# Altium footprint library Sigma_Library.PcbLib: 125 footprints (part 7 of 8)
Each footprint in its own frame and in the unit in brackets; x right, y up, seen from the top. Pads: shape width x height; smd on the part's side, far side on the other; paste and mask are expansions set on the pad; w line width, h text height; cw(c..) or ccw(c..) is an arc to the next point about the centre after c.
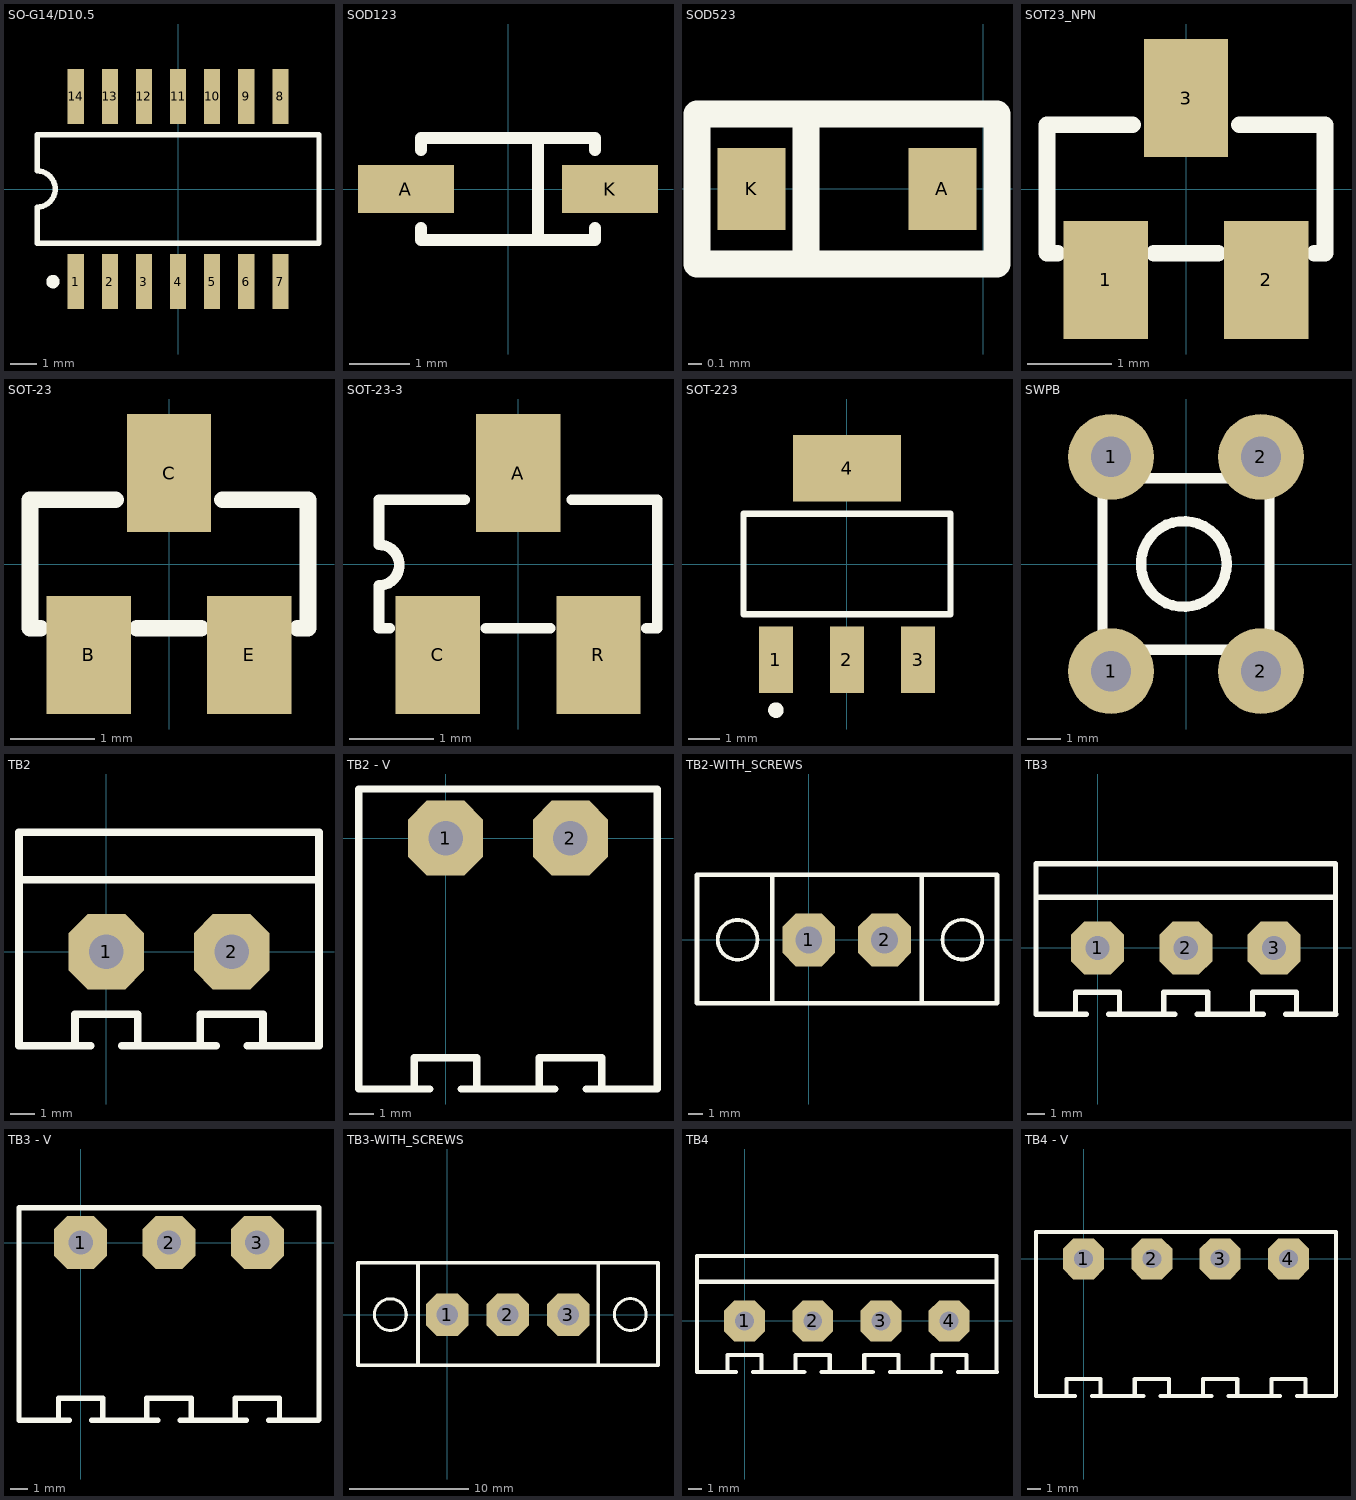
[diagram p6: the footprints below, top view; thin cyan lines are the x and y axes]

## SO-G14/D10.5 [mm] "Small Outline; 14 Leads; Body Width 5.3 mm; Pitch 1.27 mm"
height 2
pads (14):
  rect 0.6x2.05 smd: 1(-3.81,-3.45) 2(-2.54,-3.45) 3(-1.27,-3.45) 4(0,-3.45) 5(1.27,-3.45) 6(2.54,-3.45) 7(3.81,-3.45) 8(3.81,3.45) 9(2.54,3.45) 10(1.27,3.45) 11(0,3.45) 12(-1.27,3.45) 13(-2.54,3.45) 14(-3.81,3.45)
Top Overlay:
  circle w0.25: c-4.66,-3.45 r0.125
  lines w0.2: -5.25,-2.025 -5.25,-0.675 ccw(c-5.25,0) -5.25,0.675 -5.25,2.025 5.25,2.025 5.25,-2.025 -5.25,-2.025

## SOD123 [mm] "SOD-123; 2 Leads; Body 2.7 x 1.6 mm, (LxW)"
height 1.35
pads (2):
  rect 1.6x0.8 smd: A(-1.7,0) K(1.7,0)
Top Overlay:
  lines w0.2: -1.45,-0.65 -1.45,-0.85 1.45,-0.85 1.45,-0.65 ; -1.45,0.65 -1.45,0.85 1.45,0.85 1.45,0.65 ; 0.5,-0.85 0.5,0.85

## SOD523 [mm] "Diode 1n4148"
height 1.35
pads (2):
  rect 0.5x0.6 smd: A(-0.3,0) K(-1.7,0)
Top Overlay:
  lines w0.2: -1.3,-0.5 -1.3,0.5 ; -2.1,-0.55 0.1,-0.55 0.1,0.55 -2.1,0.55 -2.1,-0.55

## SOT23_NPN [mm]
pads (3):
  rect 1x1.4 smd: 1(-0.953,-1.079) 2(0.953,-1.079) 3(0,1.079)
Top Overlay:
  lines w0.2: -1.524,-0.762 -1.651,-0.762 -1.651,0.762 -0.635,0.762 ; -0.381,-0.762 0.381,-0.762 ; 0.635,0.762 1.651,0.762 1.651,-0.762 1.524,-0.762
3D body "SOT-23-1.STEP": height 0.98, standoff -0.01, extent -1.46,-1.274 1.46,1.274

## SOT-23 [mm]
pads (3):
  rect 1x1.4 smd: B(-0.953,-1.079) C(0,1.079) E(0.953,-1.079)
Top Overlay:
  lines w0.2: -1.524,-0.762 -1.651,-0.762 -1.651,0.762 -0.635,0.762 ; -0.381,-0.762 0.381,-0.762 ; 0.635,0.762 1.651,0.762 1.651,-0.762 1.524,-0.762
3D body "SOT-23-1.STEP": height 0.98, standoff -0.01, extent -1.46,-1.274 1.46,1.274

## SOT-23-3 [mm]
height 1.75
pads (3):
  rect 1x1.4 smd: A(0,1.079) C(-0.953,-1.079) R(0.953,-1.079)
Top Overlay:
  lines w0.127: -1.524,-0.762 -1.651,-0.762 -1.651,-0.254 ccw(c-1.651,-0.013) -1.651,0.229 -1.651,0.762 -0.635,0.762 ; -0.381,-0.762 0.381,-0.762 ; 0.635,0.762 1.651,0.762 1.651,-0.762 1.524,-0.762
3D body "SOT-23-1.STEP": height 0.98, standoff -0.01, extent -1.46,-1.274 1.46,1.274

## SOT-223 [mm] "SOT-223/SC-73; 4 Leads; Body 6.7 x 7.3 mm, inc. leads (LxW max)"
height 1.8
pads (4):
  rect 1.1x2.15 smd: 1(-2.3,-3.1) 2(0,-3.1) 3(2.3,-3.1)
  rect 3.5x2.15 smd: 4(0,3.1)
Top Overlay:
  circle w0.25: c-2.3,-4.725 r0.125
  lines w0.2: -3.35,-1.625 3.35,-1.625 3.35,1.625 -3.35,1.625 -3.35,-1.625
3D body "SOT223-3.step": height 1.6, standoff 0, extent -3.249,-3.613 3.251,3.461

## SWPB [mil]
pads (4):
  round 100 hole 47.24: 1(-87.5,-125) 1(-87.5,125) 2(87.5,-125) 2(87.5,125)
Top Overlay:
  circle w12: c-2.5,0 r50
  lines w12: -97.5,-100 97.5,-100 97.5,100 -97.5,100 -97.5,-100
3D body "c-1825967-1-c-3d.stp": height 311.02, standoff -122.05, extent -118.22,-153.41 118,153.41

## TB2 [mil] "Terminal Block Straight"
pads (2):
  oct 120x120 hole 55.12: 1(0,0) 2(200,0)
Top Overlay:
  lines w12: -139.37,115 339.37,115 ; -50,-150 -50,-100 50,-100 50,-150 ; -25,-150 -139.37,-150 -139.37,75 -139.37,190.75 339.37,190.75 339.37,75 339.37,-150 225,-150 ; 25,-150 175,-150 ; 150,-150 150,-100 250,-100 250,-150

## TB2 - V [mil] "Terminal Block Vertical"
pads (2):
  oct 120x120 hole 55.12: 1(0,0) 2(200,0)
Top Overlay:
  lines w12: -139.37,75 -139.37,-401.97 -25,-401.97 ; -139.37,78.74 339.37,78.74 ; -50,-401.97 -50,-351.97 50,-351.97 50,-401.97 ; 25,-401.97 175,-401.97 ; 150,-401.97 150,-351.97 250,-351.97 250,-401.97 ; 225,-401.97 339.37,-401.97 339.37,75
3D body "15EDGRC-5.08- 02P-14-00A(H).stp": height 283.46, standoff -133.86, extent -100,-314.96 300,47.24

## TB2-WITH_SCREWS [mm] "TB2-with_screws_Straight"
pads (2):
  oct 3.54x3.54 hole 1.8: 1(0,0) 2(5.08,0)
Top Overlay:
  circle w0.254: c-4.761,0 r1.331
  circle w0.254: c10.279,0.01 r1.331
  lines w0.305: -7.476,-4.25 -7.476,4.36 ; -7.446,-4.25 7.574,-4.25 7.574,4.36 -7.446,4.36 ; -2.446,-4.25 -2.446,4.36 ; 7.514,4.36 12.599,4.36 12.599,-4.24 7.524,-4.24

## TB3 [mil] "Terminal Block Straight"
pads (3):
  oct 120x120 hole 55.12: 1(0,0) 2(200,0) 3(400,0)
Top Overlay:
  lines w12: -139.37,115 539.37,115 ; -50,-150 -50,-100 50,-100 50,-150 ; -25,-150 -139.37,-150 -139.37,75 -139.37,190.75 539.37,190.75 539.37,75 539.37,-150 ; 25,-150 175,-150 ; 150,-150 150,-100 250,-100 250,-150 ; 226,-150 376,-150 ; 351,-150 351,-100 451,-100 451,-150 ; 426,-150 540.35,-150

## TB3 - V [mil] "Terminal Block Vertical"
pads (3):
  oct 120x120 hole 55.12: 1(0,0) 2(200,0) 3(400,0)
Top Overlay:
  lines w12: -139.37,75 -139.37,-401.97 -25,-401.97 ; -139.37,78.74 539.37,78.74 ; -50,-401.97 -50,-351.97 50,-351.97 50,-401.97 ; 25,-401.97 175,-401.97 ; 150,-401.97 150,-351.97 250,-351.97 250,-401.97 ; 225,-402 375,-402 ; 225,-401.97 339.37,-401.97 ; 350,-402 350,-352 450,-352 450,-402 ; 425,-402 538,-402 539.37,-400.63 539.37,75
3D body "15EDGRC-5.08- 03P-14-00A(H).stp": height 283.46, standoff -133.86, extent -100,-314.96 500,47.24

## TB3-WITH_SCREWS [mm] "TB2-with_screws_Straight"
pads (3):
  oct 3.54x3.54 hole 1.8: 1(0,0) 2(5.08,0) 3(10.16,0)
Top Overlay:
  circle w0.254: c-4.761,0 r1.331
  circle w0.254: c15.359,0.01 r1.331
  lines w0.305: -7.476,-4.25 -7.476,4.36 ; -7.446,-4.25 12.594,-4.25 ; -7.446,4.36 12.594,4.36 17.679,4.36 17.679,-4.24 12.604,-4.24 ; -2.446,-4.25 -2.446,4.36 ; 12.654,-4.25 12.654,4.36

## TB4 [mil] "Terminal Block Straight"
pads (4):
  oct 120x120 hole 55.12: 1(0,0) 2(200,0) 3(400,0) 4(600,0)
Top Overlay:
  lines w12: -139.37,115 739.37,115 ; -50,-150 -50,-100 50,-100 50,-150 ; -25,-150 -139.37,-150 -139.37,75 -139.37,190.75 739.37,190.75 739.37,75 739.37,-150 ; 25,-150 175,-150 ; 150,-150 150,-100 250,-100 250,-150 ; 226,-150 376,-150 ; 351,-150 351,-100 451,-100 451,-150 ; 426,-150 576,-150 ; 551,-150 551,-100 651,-100 651,-150 ; 626,-150 740.35,-150

## TB4 - V [mil] "Terminal Block Vertical"
pads (4):
  oct 120x120 hole 55.12: 1(0,0) 2(200,0) 3(400,0) 4(600,0)
Top Overlay:
  lines w12: -139.37,75 -139.37,-401.97 -25,-401.97 ; -139.37,78.74 739.37,78.74 ; -50,-401.97 -50,-351.97 50,-351.97 50,-401.97 ; 25,-401.97 175,-401.97 ; 150,-401.97 150,-351.97 250,-351.97 250,-401.97 ; 225,-402 375,-402 ; 225,-401.97 339.37,-401.97 ; 350,-402 350,-352 450,-352 450,-402 ; 425,-402 575,-402 ; 550,-402 550,-352 650,-352 650,-402 ; 625,-402 738,-402 739.37,-400.63 739.37,75
3D body "15EDGRC-5.08- 04P-14-00A(H).stp": height 283.46, standoff -133.86, extent -100,-314.96 700,47.24